# Altium integrated library Weidmueller_OMNIMATE_Power.IntLib: 508 symbols (part 4 of 9) (continued)
## 1140980000_Single (continued)
OMNIMATE Power - series BL/SL 7.62HP; PartNumber: 1140980000; Manufacturer: Weidmueller; Short_text_for_material: SL 7.62HP/02/180F 3.2 SN OR BX; Side_termination_characteristic: Flange; Mounting_onto_the_PCB: Solder connection; Pitch_mm: 7.62 mm; Pitch_inch: 0.3 inch; No_of_poles: 2; Outgoing_elbow: 180°; Solder_pin_length_mm: 3.2 mm; Contact_surface: tinned; Insulating_material: PBT; UL_94_flammability_rating: V-0; Rated_voltage_for_surge_voltage_class_pollution_degree_II_2: 630 V; Rated_current_min_no_of_poles_TU_20_deg_C: 29 A; Rated_voltage_use_group_B_UL_1059: 300 V; Rated_current_use_group_B_UL_1059: 20 A; PackageReference: SL_7_62HP_180F_02; Colour: Orange; Packaging: Box; Qty: 100 PCS; Revision: V1; ComponentLink1Description: Manufacturer URL; ComponentLink1URL: http://www.weidmueller.com/; ComponentLink2Description: URL Link1; ComponentLink2URL: http://catalog.weidmueller.com/catalog/Start.do?localeId=en&ObjectID=1140980000
footprint SL_7_62HP_180F_02 (OMNIMATE Power - Serie BL/SL 7.62HP  SL 7.62HP/02/180F 3.2)
part A pins: A1
part B pins: A2

## 1140990000
designator J?
OMNIMATE Power - series BL/SL 7.62HP; PartNumber: 1140990000; Manufacturer: Weidmueller; Short_text_for_material: SL 7.62HP/03/180F 3.2 SN OR BX; Side_termination_characteristic: Flange; Mounting_onto_the_PCB: Solder connection; Pitch_mm: 7.62 mm; Pitch_inch: 0.3 inch; No_of_poles: 3; Outgoing_elbow: 180°; Solder_pin_length_mm: 3.2 mm; Contact_surface: tinned; Insulating_material: PBT; UL_94_flammability_rating: V-0; Rated_voltage_for_surge_voltage_class_pollution_degree_II_2: 630 V; Rated_current_min_no_of_poles_TU_20_deg_C: 29 A; Rated_voltage_use_group_B_UL_1059: 300 V; Rated_current_use_group_B_UL_1059: 20 A; PackageReference: SL_7_62HP_180F_03; Colour: Orange; Packaging: Box; Qty: 100 PCS; Revision: V1; ComponentLink1Description: Manufacturer URL; ComponentLink1URL: http://www.weidmueller.com/; ComponentLink2Description: URL Link1; ComponentLink2URL: http://catalog.weidmueller.com/catalog/Start.do?localeId=en&ObjectID=1140990000
footprint SL_7_62HP_180F_03 (OMNIMATE Power - Serie BL/SL 7.62HP  SL 7.62HP/03/180F 3.2)
pins: A1, A2, A3

## 1140990000_Single
designator J?
OMNIMATE Power - series BL/SL 7.62HP; PartNumber: 1140990000; Manufacturer: Weidmueller; Short_text_for_material: SL 7.62HP/03/180F 3.2 SN OR BX; Side_termination_characteristic: Flange; Mounting_onto_the_PCB: Solder connection; Pitch_mm: 7.62 mm; Pitch_inch: 0.3 inch; No_of_poles: 3; Outgoing_elbow: 180°; Solder_pin_length_mm: 3.2 mm; Contact_surface: tinned; Insulating_material: PBT; UL_94_flammability_rating: V-0; Rated_voltage_for_surge_voltage_class_pollution_degree_II_2: 630 V; Rated_current_min_no_of_poles_TU_20_deg_C: 29 A; Rated_voltage_use_group_B_UL_1059: 300 V; Rated_current_use_group_B_UL_1059: 20 A; PackageReference: SL_7_62HP_180F_03; Colour: Orange; Packaging: Box; Qty: 100 PCS; Revision: V1; ComponentLink1Description: Manufacturer URL; ComponentLink1URL: http://www.weidmueller.com/; ComponentLink2Description: URL Link1; ComponentLink2URL: http://catalog.weidmueller.com/catalog/Start.do?localeId=en&ObjectID=1140990000
footprint SL_7_62HP_180F_03 (OMNIMATE Power - Serie BL/SL 7.62HP  SL 7.62HP/03/180F 3.2)
part A pins: A1
part B pins: A2
part C pins: A3

## 1141000000
designator J?
OMNIMATE Power - series BL/SL 7.62HP; PartNumber: 1141000000; Manufacturer: Weidmueller; Short_text_for_material: SL 7.62HP/04/180F 3.2 SN OR BX; Side_termination_characteristic: Flange; Mounting_onto_the_PCB: Solder connection; Pitch_mm: 7.62 mm; Pitch_inch: 0.3 inch; No_of_poles: 4; Outgoing_elbow: 180°; Solder_pin_length_mm: 3.2 mm; Contact_surface: tinned; Insulating_material: PBT; UL_94_flammability_rating: V-0; Rated_voltage_for_surge_voltage_class_pollution_degree_II_2: 630 V; Rated_current_min_no_of_poles_TU_20_deg_C: 29 A; Rated_voltage_use_group_B_UL_1059: 300 V; Rated_current_use_group_B_UL_1059: 20 A; PackageReference: SL_7_62HP_180F_04; Colour: Orange; Packaging: Box; Qty: 100 PCS; Revision: V1; ComponentLink1Description: Manufacturer URL; ComponentLink1URL: http://www.weidmueller.com/; ComponentLink2Description: URL Link1; ComponentLink2URL: http://catalog.weidmueller.com/catalog/Start.do?localeId=en&ObjectID=1141000000
footprint SL_7_62HP_180F_04 (OMNIMATE Power - Serie BL/SL 7.62HP  SL 7.62HP/04/180F 3.2)
pins: A1, A2, A3, A4

## 1141000000_Single
designator J?
OMNIMATE Power - series BL/SL 7.62HP; PartNumber: 1141000000; Manufacturer: Weidmueller; Short_text_for_material: SL 7.62HP/04/180F 3.2 SN OR BX; Side_termination_characteristic: Flange; Mounting_onto_the_PCB: Solder connection; Pitch_mm: 7.62 mm; Pitch_inch: 0.3 inch; No_of_poles: 4; Outgoing_elbow: 180°; Solder_pin_length_mm: 3.2 mm; Contact_surface: tinned; Insulating_material: PBT; UL_94_flammability_rating: V-0; Rated_voltage_for_surge_voltage_class_pollution_degree_II_2: 630 V; Rated_current_min_no_of_poles_TU_20_deg_C: 29 A; Rated_voltage_use_group_B_UL_1059: 300 V; Rated_current_use_group_B_UL_1059: 20 A; PackageReference: SL_7_62HP_180F_04; Colour: Orange; Packaging: Box; Qty: 100 PCS; Revision: V1; ComponentLink1Description: Manufacturer URL; ComponentLink1URL: http://www.weidmueller.com/; ComponentLink2Description: URL Link1; ComponentLink2URL: http://catalog.weidmueller.com/catalog/Start.do?localeId=en&ObjectID=1141000000
footprint SL_7_62HP_180F_04 (OMNIMATE Power - Serie BL/SL 7.62HP  SL 7.62HP/04/180F 3.2)
part A pins: A1
part B pins: A2
part C pins: A3
part D pins: A4

## 1141040000
designator J?
OMNIMATE Power - series BL/SL 7.62HP; PartNumber: 1141040000; Manufacturer: Weidmueller; Short_text_for_material: SL 7.62HP/08/180F 3.2 SN OR BX; Side_termination_characteristic: Flange; Mounting_onto_the_PCB: Solder connection; Pitch_mm: 7.62 mm; Pitch_inch: 0.3 inch; No_of_poles: 8; Outgoing_elbow: 180°; Solder_pin_length_mm: 3.2 mm; Contact_surface: tinned; Insulating_material: PBT; UL_94_flammability_rating: V-0; Rated_voltage_for_surge_voltage_class_pollution_degree_II_2: 630 V; Rated_current_min_no_of_poles_TU_20_deg_C: 29 A; Rated_voltage_use_group_B_UL_1059: 300 V; Rated_current_use_group_B_UL_1059: 20 A; PackageReference: SL_7_62HP_180F_08; Colour: Orange; Packaging: Box; Qty: 50 PCS; Revision: V1; ComponentLink1Description: Manufacturer URL; ComponentLink1URL: http://www.weidmueller.com/; ComponentLink2Description: URL Link1; ComponentLink2URL: http://catalog.weidmueller.com/catalog/Start.do?localeId=en&ObjectID=1141040000
footprint SL_7_62HP_180F_08 (OMNIMATE Power - Serie BL/SL 7.62HP  SL 7.62HP/08/180F 3.2)
pins: A1, A2, A3, A4, A5, A6, A7, A8

## 1141040000_Single
designator J?
OMNIMATE Power - series BL/SL 7.62HP; PartNumber: 1141040000; Manufacturer: Weidmueller; Short_text_for_material: SL 7.62HP/08/180F 3.2 SN OR BX; Side_termination_characteristic: Flange; Mounting_onto_the_PCB: Solder connection; Pitch_mm: 7.62 mm; Pitch_inch: 0.3 inch; No_of_poles: 8; Outgoing_elbow: 180°; Solder_pin_length_mm: 3.2 mm; Contact_surface: tinned; Insulating_material: PBT; UL_94_flammability_rating: V-0; Rated_voltage_for_surge_voltage_class_pollution_degree_II_2: 630 V; Rated_current_min_no_of_poles_TU_20_deg_C: 29 A; Rated_voltage_use_group_B_UL_1059: 300 V; Rated_current_use_group_B_UL_1059: 20 A; PackageReference: SL_7_62HP_180F_08; Colour: Orange; Packaging: Box; Qty: 50 PCS; Revision: V1; ComponentLink1Description: Manufacturer URL; ComponentLink1URL: http://www.weidmueller.com/; ComponentLink2Description: URL Link1; ComponentLink2URL: http://catalog.weidmueller.com/catalog/Start.do?localeId=en&ObjectID=1141040000
footprint SL_7_62HP_180F_08 (OMNIMATE Power - Serie BL/SL 7.62HP  SL 7.62HP/08/180F 3.2)
part A pins: A1
part B pins: A2
part C pins: A3
part D pins: A4
part E pins: A5
part F pins: A6
part G pins: A7
part H pins: A8

## 1156130000
designator J?
OMNIMATE Power - series BV/SV 7.62HP; PartNumber: 1156130000; Manufacturer: Weidmueller; Short_text_for_material: SV 7.62HP/02/270MSF2 SC/08R SN BK BX; Side_termination_characteristic: closed side; Note: Middle screw flange; Mounting_onto_the_PCB: Solder connection; Pitch_mm: 7.62 mm; Pitch_inch: 0.3 inch; No_of_poles: 2; Outgoing_elbow: 270°; Solder_pin_length_mm: 3.5 mm; Contact_material: Cu-Leg; Contact_surface: tinned; Insulating_material: PA GF; UL_94_flammability_rating: V-0; Rated_voltage_for_surge_voltage_class_pollution_degree_II_2: 1000 V; Rated_voltage_use_group_B_UL_1059: 300 V; Rated_current_use_group_B_UL_1059: 35 A; PackageReference: SV_7_62HP_02_SC_3_81_270MSF_08; Colour: Black; Packaging: Box; Qty: 48 PCS; Revision: V1; ComponentLink1Description: Manufacturer URL; ComponentLink1URL: http://www.weidmueller.com/; ComponentLink2Description: URL Link1; ComponentLink2URL: http://catalog.weidmueller.com/catalog/Start.do?localeId=en&ObjectID=1156130000
footprint SV_7_62HP_02_SC_3_81_270MSF_08 (OMNIMATE Power - Serie BV/SV 7.62HP  SV 7.62HP/02/270MSF2 SC/08R)
part A pins: P1, P2
part B pins: SA1, SA2, SA3, SA4
part C pins: SB1, SB2, SB3, SB4

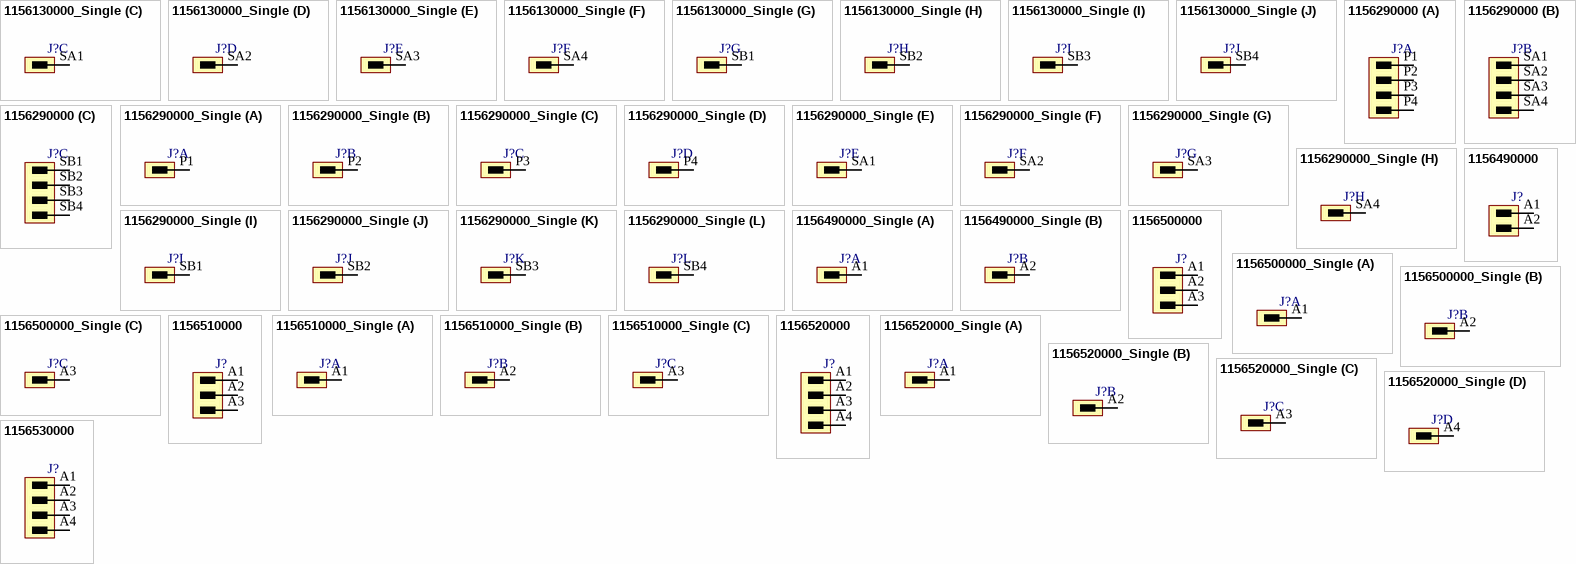
[diagram p13: symbols 1156130000_Single to 1156530000]

## 1156130000_Single
designator J?
OMNIMATE Power - series BV/SV 7.62HP; PartNumber: 1156130000; Manufacturer: Weidmueller; Short_text_for_material: SV 7.62HP/02/270MSF2 SC/08R SN BK BX; Side_termination_characteristic: closed side; Note: Middle screw flange; Mounting_onto_the_PCB: Solder connection; Pitch_mm: 7.62 mm; Pitch_inch: 0.3 inch; No_of_poles: 2; Outgoing_elbow: 270°; Solder_pin_length_mm: 3.5 mm; Contact_material: Cu-Leg; Contact_surface: tinned; Insulating_material: PA GF; UL_94_flammability_rating: V-0; Rated_voltage_for_surge_voltage_class_pollution_degree_II_2: 1000 V; Rated_voltage_use_group_B_UL_1059: 300 V; Rated_current_use_group_B_UL_1059: 35 A; PackageReference: SV_7_62HP_02_SC_3_81_270MSF_08; Colour: Black; Packaging: Box; Qty: 48 PCS; Revision: V1; ComponentLink1Description: Manufacturer URL; ComponentLink1URL: http://www.weidmueller.com/; ComponentLink2Description: URL Link1; ComponentLink2URL: http://catalog.weidmueller.com/catalog/Start.do?localeId=en&ObjectID=1156130000
footprint SV_7_62HP_02_SC_3_81_270MSF_08 (OMNIMATE Power - Serie BV/SV 7.62HP  SV 7.62HP/02/270MSF2 SC/08R)
part A pins: P1
part B pins: P2
part C pins: SA1
part D pins: SA2
part E pins: SA3
part F pins: SA4
part G pins: SB1
part H pins: SB2
part I pins: SB3
part J pins: SB4

## 1156290000
designator J?
OMNIMATE Power - series BV/SV 7.62HP; PartNumber: 1156290000; Manufacturer: Weidmueller; Short_text_for_material: SV 7.62HP/04/270MSF4 SC/08R SN BK BX; Side_termination_characteristic: closed side; Note: Middle screw flange; Mounting_onto_the_PCB: Solder connection; Pitch_mm: 7.62 mm; Pitch_inch: 0.3 inch; No_of_poles: 4; Outgoing_elbow: 270°; Solder_pin_length_mm: 3.5 mm; Contact_material: Cu-Leg; Contact_surface: tinned; Insulating_material: PA GF; UL_94_flammability_rating: V-0; Rated_voltage_for_surge_voltage_class_pollution_degree_II_2: 1000 V; Rated_voltage_use_group_B_UL_1059: 300 V; Rated_current_use_group_B_UL_1059: 35 A; PackageReference: SV_7_62HP_04_SC_3_81_270MSF_08; Colour: Black; Packaging: Box; Qty: 30 PCS; Revision: V1; ComponentLink1Description: Manufacturer URL; ComponentLink1URL: http://www.weidmueller.com/; ComponentLink2Description: URL Link1; ComponentLink2URL: http://catalog.weidmueller.com/catalog/Start.do?localeId=en&ObjectID=1156290000
footprint SV_7_62HP_04_SC_3_81_270MSF_08 (OMNIMATE Power - Serie BV/SV 7.62HP  SV 7.62HP/04/270MSF4 SC/08)
part A pins: P1, P2, P3, P4
part B pins: SA1, SA2, SA3, SA4
part C pins: SB1, SB2, SB3, SB4

## 1156290000_Single
designator J?
OMNIMATE Power - series BV/SV 7.62HP; PartNumber: 1156290000; Manufacturer: Weidmueller; Short_text_for_material: SV 7.62HP/04/270MSF4 SC/08R SN BK BX; Side_termination_characteristic: closed side; Note: Middle screw flange; Mounting_onto_the_PCB: Solder connection; Pitch_mm: 7.62 mm; Pitch_inch: 0.3 inch; No_of_poles: 4; Outgoing_elbow: 270°; Solder_pin_length_mm: 3.5 mm; Contact_material: Cu-Leg; Contact_surface: tinned; Insulating_material: PA GF; UL_94_flammability_rating: V-0; Rated_voltage_for_surge_voltage_class_pollution_degree_II_2: 1000 V; Rated_voltage_use_group_B_UL_1059: 300 V; Rated_current_use_group_B_UL_1059: 35 A; PackageReference: SV_7_62HP_04_SC_3_81_270MSF_08; Colour: Black; Packaging: Box; Qty: 30 PCS; Revision: V1; ComponentLink1Description: Manufacturer URL; ComponentLink1URL: http://www.weidmueller.com/; ComponentLink2Description: URL Link1; ComponentLink2URL: http://catalog.weidmueller.com/catalog/Start.do?localeId=en&ObjectID=1156290000
footprint SV_7_62HP_04_SC_3_81_270MSF_08 (OMNIMATE Power - Serie BV/SV 7.62HP  SV 7.62HP/04/270MSF4 SC/08)
part A pins: P1
part B pins: P2
part C pins: P3
part D pins: P4
part E pins: SA1
part F pins: SA2
part G pins: SA3
part H pins: SA4
part I pins: SB1
part J pins: SB2
part K pins: SB3
part L pins: SB4

## 1156490000
designator J?
OMNIMATE Power - series BV/SV 7.62IT; PartNumber: 1156490000; Manufacturer: Weidmueller; Short_text_for_material: SV 7.62IT/02/270MF2 3.5SN BK BX SO; Side_termination_characteristic: closed side; Note: Middle flange; Mounting_onto_the_PCB: Solder connection; Pitch_mm: 7.62 mm; Pitch_inch: 0.3 inch; No_of_poles: 2; Outgoing_elbow: 270°; Solder_pin_length_mm: 3.5 mm; Contact_material: Cu-Leg; Contact_surface: tinned; Insulating_material: PA GF; UL_94_flammability_rating: V-0; Rated_voltage_for_surge_voltage_class_pollution_degree_II_2: 1000 V; Rated_voltage_use_group_B_UL_1059: 300 V; Rated_current_use_group_B_UL_1059: 40.5 A; PackageReference: SV_7_62IT_270MF2_02; Colour: Black; Packaging: Box; Qty: 78 PCS; Revision: V1; ComponentLink1Description: Manufacturer URL; ComponentLink1URL: http://www.weidmueller.com/; ComponentLink2Description: URL Link1; ComponentLink2URL: http://catalog.weidmueller.com/catalog/Start.do?localeId=en&ObjectID=1156490000
footprint SV_7_62IT_270MF2_02 (OMNIMATE Power - Serie BV/SV 7.62IT  SV 7.62IT/02/270MF2 3.5)
pins: A1, A2

## 1156490000_Single
designator J?
OMNIMATE Power - series BV/SV 7.62IT; PartNumber: 1156490000; Manufacturer: Weidmueller; Short_text_for_material: SV 7.62IT/02/270MF2 3.5SN BK BX SO; Side_termination_characteristic: closed side; Note: Middle flange; Mounting_onto_the_PCB: Solder connection; Pitch_mm: 7.62 mm; Pitch_inch: 0.3 inch; No_of_poles: 2; Outgoing_elbow: 270°; Solder_pin_length_mm: 3.5 mm; Contact_material: Cu-Leg; Contact_surface: tinned; Insulating_material: PA GF; UL_94_flammability_rating: V-0; Rated_voltage_for_surge_voltage_class_pollution_degree_II_2: 1000 V; Rated_voltage_use_group_B_UL_1059: 300 V; Rated_current_use_group_B_UL_1059: 40.5 A; PackageReference: SV_7_62IT_270MF2_02; Colour: Black; Packaging: Box; Qty: 78 PCS; Revision: V1; ComponentLink1Description: Manufacturer URL; ComponentLink1URL: http://www.weidmueller.com/; ComponentLink2Description: URL Link1; ComponentLink2URL: http://catalog.weidmueller.com/catalog/Start.do?localeId=en&ObjectID=1156490000
footprint SV_7_62IT_270MF2_02 (OMNIMATE Power - Serie BV/SV 7.62IT  SV 7.62IT/02/270MF2 3.5)
part A pins: A1
part B pins: A2

## 1156500000
designator J?
OMNIMATE Power - series BV/SV 7.62IT; PartNumber: 1156500000; Manufacturer: Weidmueller; Short_text_for_material: SV 7.62IT/03/270MF2 3.5SN BK BX; Side_termination_characteristic: closed side; Note: Middle flange; Mounting_onto_the_PCB: Solder connection; Pitch_mm: 7.62 mm; Pitch_inch: 0.3 inch; No_of_poles: 3; Outgoing_elbow: 270°; Solder_pin_length_mm: 3.5 mm; Contact_material: Cu-Leg; Contact_surface: tinned; Insulating_material: PA GF; UL_94_flammability_rating: V-0; Rated_voltage_for_surge_voltage_class_pollution_degree_II_2: 1000 V; Rated_voltage_use_group_B_UL_1059: 300 V; Rated_current_use_group_B_UL_1059: 40.5 A; PackageReference: SV_7_62IT_270MF2_03; Colour: Black; Packaging: Box; Qty: 60 PCS; Revision: V1; ComponentLink1Description: Manufacturer URL; ComponentLink1URL: http://www.weidmueller.com/; ComponentLink2Description: URL Link1; ComponentLink2URL: http://catalog.weidmueller.com/catalog/Start.do?localeId=en&ObjectID=1156500000
footprint SV_7_62IT_270MF2_03 (OMNIMATE Power - Serie BV/SV 7.62IT  SV 7.62IT/02/270MF3 3.5)
pins: A1, A2, A3

## 1156500000_Single
designator J?
OMNIMATE Power - series BV/SV 7.62IT; PartNumber: 1156500000; Manufacturer: Weidmueller; Short_text_for_material: SV 7.62IT/03/270MF2 3.5SN BK BX; Side_termination_characteristic: closed side; Note: Middle flange; Mounting_onto_the_PCB: Solder connection; Pitch_mm: 7.62 mm; Pitch_inch: 0.3 inch; No_of_poles: 3; Outgoing_elbow: 270°; Solder_pin_length_mm: 3.5 mm; Contact_material: Cu-Leg; Contact_surface: tinned; Insulating_material: PA GF; UL_94_flammability_rating: V-0; Rated_voltage_for_surge_voltage_class_pollution_degree_II_2: 1000 V; Rated_voltage_use_group_B_UL_1059: 300 V; Rated_current_use_group_B_UL_1059: 40.5 A; PackageReference: SV_7_62IT_270MF2_03; Colour: Black; Packaging: Box; Qty: 60 PCS; Revision: V1; ComponentLink1Description: Manufacturer URL; ComponentLink1URL: http://www.weidmueller.com/; ComponentLink2Description: URL Link1; ComponentLink2URL: http://catalog.weidmueller.com/catalog/Start.do?localeId=en&ObjectID=1156500000
footprint SV_7_62IT_270MF2_03 (OMNIMATE Power - Serie BV/SV 7.62IT  SV 7.62IT/02/270MF3 3.5)
part A pins: A1
part B pins: A2
part C pins: A3

## 1156510000
designator J?
OMNIMATE Power - series BV/SV 7.62IT; PartNumber: 1156510000; Manufacturer: Weidmueller; Short_text_for_material: SV 7.62IT/03/270MF3 3.5SN BK BX; Side_termination_characteristic: closed side; Note: Middle flange; Mounting_onto_the_PCB: Solder connection; Pitch_mm: 7.62 mm; Pitch_inch: 0.3 inch; No_of_poles: 3; Outgoing_elbow: 270°; Solder_pin_length_mm: 3.5 mm; Contact_material: Cu-Leg; Contact_surface: tinned; Insulating_material: PA GF; UL_94_flammability_rating: V-0; Rated_voltage_for_surge_voltage_class_pollution_degree_II_2: 1000 V; Rated_voltage_use_group_B_UL_1059: 300 V; Rated_current_use_group_B_UL_1059: 40.5 A; PackageReference: SV_7_62IT_270MF3_03; Colour: Black; Packaging: Box; Qty: 60 PCS; Revision: V1; ComponentLink1Description: Manufacturer URL; ComponentLink1URL: http://www.weidmueller.com/; ComponentLink2Description: URL Link1; ComponentLink2URL: http://catalog.weidmueller.com/catalog/Start.do?localeId=en&ObjectID=1156510000
footprint SV_7_62IT_270MF3_03 (OMNIMATE Power - Serie BV/SV 7.62IT  SV 7.62IT/03/270MF3 3.5)
pins: A1, A2, A3

## 1156510000_Single
designator J?
OMNIMATE Power - series BV/SV 7.62IT; PartNumber: 1156510000; Manufacturer: Weidmueller; Short_text_for_material: SV 7.62IT/03/270MF3 3.5SN BK BX; Side_termination_characteristic: closed side; Note: Middle flange; Mounting_onto_the_PCB: Solder connection; Pitch_mm: 7.62 mm; Pitch_inch: 0.3 inch; No_of_poles: 3; Outgoing_elbow: 270°; Solder_pin_length_mm: 3.5 mm; Contact_material: Cu-Leg; Contact_surface: tinned; Insulating_material: PA GF; UL_94_flammability_rating: V-0; Rated_voltage_for_surge_voltage_class_pollution_degree_II_2: 1000 V; Rated_voltage_use_group_B_UL_1059: 300 V; Rated_current_use_group_B_UL_1059: 40.5 A; PackageReference: SV_7_62IT_270MF3_03; Colour: Black; Packaging: Box; Qty: 60 PCS; Revision: V1; ComponentLink1Description: Manufacturer URL; ComponentLink1URL: http://www.weidmueller.com/; ComponentLink2Description: URL Link1; ComponentLink2URL: http://catalog.weidmueller.com/catalog/Start.do?localeId=en&ObjectID=1156510000
footprint SV_7_62IT_270MF3_03 (OMNIMATE Power - Serie BV/SV 7.62IT  SV 7.62IT/03/270MF3 3.5)
part A pins: A1
part B pins: A2
part C pins: A3

## 1156520000
designator J?
OMNIMATE Power - series BV/SV 7.62IT; PartNumber: 1156520000; Manufacturer: Weidmueller; Short_text_for_material: SV 7.62IT/04/270MF2 3.5SN BK BX; Side_termination_characteristic: closed side; Note: Middle flange; Mounting_onto_the_PCB: Solder connection; Pitch_mm: 7.62 mm; Pitch_inch: 0.3 inch; No_of_poles: 4; Outgoing_elbow: 270°; Solder_pin_length_mm: 3.5 mm; Contact_material: Cu-Leg; Contact_surface: tinned; Insulating_material: PA GF; UL_94_flammability_rating: V-0; Rated_voltage_for_surge_voltage_class_pollution_degree_II_2: 1000 V; Rated_voltage_use_group_B_UL_1059: 300 V; Rated_current_use_group_B_UL_1059: 40.5 A; PackageReference: SV_7_62IT_270MF2_04; Colour: Black; Packaging: Box; Qty: 48 PCS; Revision: V1; ComponentLink1Description: Manufacturer URL; ComponentLink1URL: http://www.weidmueller.com/; ComponentLink2Description: URL Link1; ComponentLink2URL: http://catalog.weidmueller.com/catalog/Start.do?localeId=en&ObjectID=1156520000
footprint SV_7_62IT_270MF2_04 (OMNIMATE Power - Serie BV/SV 7.62IT  SV 7.62IT/02/270MF4 3.5)
pins: A1, A2, A3, A4

## 1156520000_Single
designator J?
OMNIMATE Power - series BV/SV 7.62IT; PartNumber: 1156520000; Manufacturer: Weidmueller; Short_text_for_material: SV 7.62IT/04/270MF2 3.5SN BK BX; Side_termination_characteristic: closed side; Note: Middle flange; Mounting_onto_the_PCB: Solder connection; Pitch_mm: 7.62 mm; Pitch_inch: 0.3 inch; No_of_poles: 4; Outgoing_elbow: 270°; Solder_pin_length_mm: 3.5 mm; Contact_material: Cu-Leg; Contact_surface: tinned; Insulating_material: PA GF; UL_94_flammability_rating: V-0; Rated_voltage_for_surge_voltage_class_pollution_degree_II_2: 1000 V; Rated_voltage_use_group_B_UL_1059: 300 V; Rated_current_use_group_B_UL_1059: 40.5 A; PackageReference: SV_7_62IT_270MF2_04; Colour: Black; Packaging: Box; Qty: 48 PCS; Revision: V1; ComponentLink1Description: Manufacturer URL; ComponentLink1URL: http://www.weidmueller.com/; ComponentLink2Description: URL Link1; ComponentLink2URL: http://catalog.weidmueller.com/catalog/Start.do?localeId=en&ObjectID=1156520000
footprint SV_7_62IT_270MF2_04 (OMNIMATE Power - Serie BV/SV 7.62IT  SV 7.62IT/02/270MF4 3.5)
part A pins: A1
part B pins: A2
part C pins: A3
part D pins: A4

## 1156530000
designator J?
OMNIMATE Power - series BV/SV 7.62IT; PartNumber: 1156530000; Manufacturer: Weidmueller; Short_text_for_material: SV 7.62IT/04/270MF4 3.5SN BK BX; Side_termination_characteristic: closed side; Note: Middle flange; Mounting_onto_the_PCB: Solder connection; Pitch_mm: 7.62 mm; Pitch_inch: 0.3 inch; No_of_poles: 4; Outgoing_elbow: 270°; Solder_pin_length_mm: 3.5 mm; Contact_material: Cu-Leg; Contact_surface: tinned; Insulating_material: PA GF; UL_94_flammability_rating: V-0; Rated_voltage_for_surge_voltage_class_pollution_degree_II_2: 1000 V; Rated_voltage_use_group_B_UL_1059: 300 V; Rated_current_use_group_B_UL_1059: 40.5 A; PackageReference: SV_7_62IT_270MF4_04; Colour: Black; Packaging: Box; Qty: 48 PCS; Revision: V1; ComponentLink1Description: Manufacturer URL; ComponentLink1URL: http://www.weidmueller.com/; ComponentLink2Description: URL Link1; ComponentLink2URL: http://catalog.weidmueller.com/catalog/Start.do?localeId=en&ObjectID=1156530000
footprint SV_7_62IT_270MF4_04 (OMNIMATE Power - Serie BV/SV 7.62IT  SV 7.62IT/04/270MF4 3.5)
pins: A1, A2, A3, A4

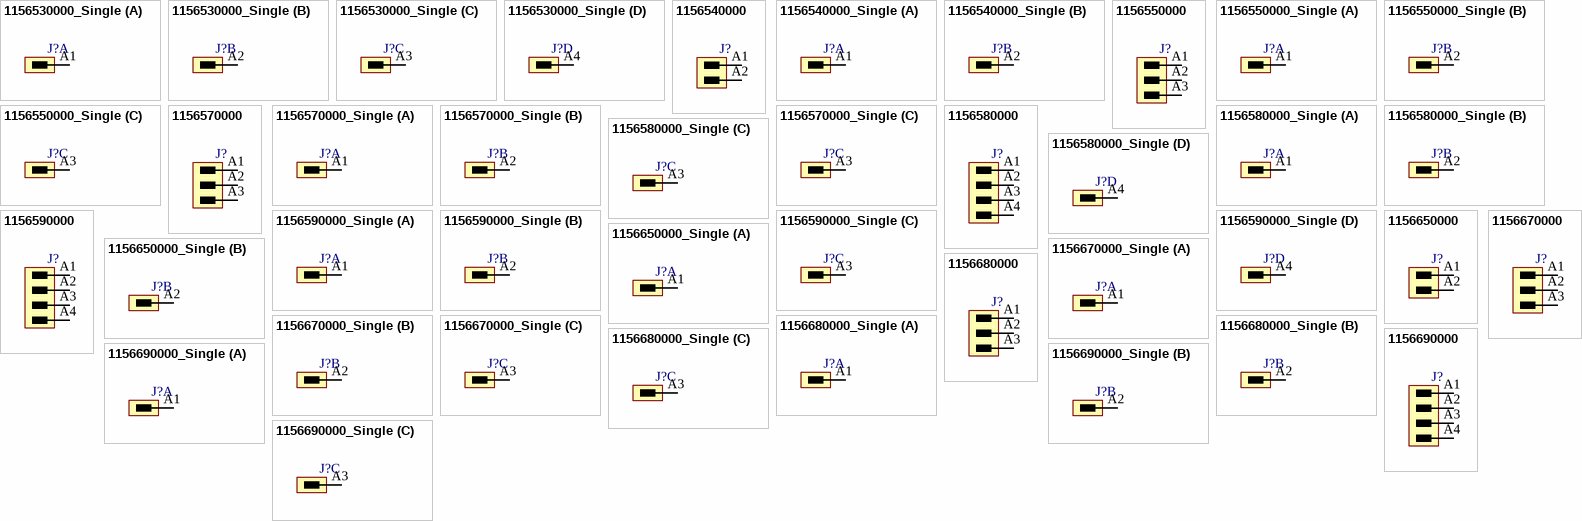
[diagram p14: symbols 1156530000_Single to 1156690000_Single]

## 1156530000_Single
designator J?
OMNIMATE Power - series BV/SV 7.62IT; PartNumber: 1156530000; Manufacturer: Weidmueller; Short_text_for_material: SV 7.62IT/04/270MF4 3.5SN BK BX; Side_termination_characteristic: closed side; Note: Middle flange; Mounting_onto_the_PCB: Solder connection; Pitch_mm: 7.62 mm; Pitch_inch: 0.3 inch; No_of_poles: 4; Outgoing_elbow: 270°; Solder_pin_length_mm: 3.5 mm; Contact_material: Cu-Leg; Contact_surface: tinned; Insulating_material: PA GF; UL_94_flammability_rating: V-0; Rated_voltage_for_surge_voltage_class_pollution_degree_II_2: 1000 V; Rated_voltage_use_group_B_UL_1059: 300 V; Rated_current_use_group_B_UL_1059: 40.5 A; PackageReference: SV_7_62IT_270MF4_04; Colour: Black; Packaging: Box; Qty: 48 PCS; Revision: V1; ComponentLink1Description: Manufacturer URL; ComponentLink1URL: http://www.weidmueller.com/; ComponentLink2Description: URL Link1; ComponentLink2URL: http://catalog.weidmueller.com/catalog/Start.do?localeId=en&ObjectID=1156530000
footprint SV_7_62IT_270MF4_04 (OMNIMATE Power - Serie BV/SV 7.62IT  SV 7.62IT/04/270MF4 3.5)
part A pins: A1
part B pins: A2
part C pins: A3
part D pins: A4

## 1156540000
designator J?
OMNIMATE Power - series BV/SV 7.62IT; PartNumber: 1156540000; Manufacturer: Weidmueller; Short_text_for_material: SV 7.62IT/02/90MF2 3.5SN BK BX SO; Side_termination_characteristic: closed side; Note: Middle flange; Mounting_onto_the_PCB: Solder connection; Pitch_mm: 7.62 mm; Pitch_inch: 0.3 inch; No_of_poles: 2; Outgoing_elbow: 270°; Solder_pin_length_mm: 3.5 mm; Contact_material: Cu-Leg; Contact_surface: tinned; Insulating_material: PA GF; UL_94_flammability_rating: V-0; Rated_voltage_for_surge_voltage_class_pollution_degree_II_2: 1000 V; Rated_voltage_use_group_B_UL_1059: 300 V; Rated_current_use_group_B_UL_1059: 40.5 A; PackageReference: SV_7_62IT_90MF2_02; Colour: Black; Packaging: Box; Qty: 78 PCS; Revision: V1; ComponentLink1Description: Manufacturer URL; ComponentLink1URL: http://www.weidmueller.com/; ComponentLink2Description: URL Link1; ComponentLink2URL: http://catalog.weidmueller.com/catalog/Start.do?localeId=en&ObjectID=1156540000
footprint SV_7_62IT_90MF2_02 (OMNIMATE Power - Serie BV/SV 7.62IT  SV 7.62IT/02/90MF2 3.5)
pins: A1, A2

## 1156540000_Single
designator J?
OMNIMATE Power - series BV/SV 7.62IT; PartNumber: 1156540000; Manufacturer: Weidmueller; Short_text_for_material: SV 7.62IT/02/90MF2 3.5SN BK BX SO; Side_termination_characteristic: closed side; Note: Middle flange; Mounting_onto_the_PCB: Solder connection; Pitch_mm: 7.62 mm; Pitch_inch: 0.3 inch; No_of_poles: 2; Outgoing_elbow: 270°; Solder_pin_length_mm: 3.5 mm; Contact_material: Cu-Leg; Contact_surface: tinned; Insulating_material: PA GF; UL_94_flammability_rating: V-0; Rated_voltage_for_surge_voltage_class_pollution_degree_II_2: 1000 V; Rated_voltage_use_group_B_UL_1059: 300 V; Rated_current_use_group_B_UL_1059: 40.5 A; PackageReference: SV_7_62IT_90MF2_02; Colour: Black; Packaging: Box; Qty: 78 PCS; Revision: V1; ComponentLink1Description: Manufacturer URL; ComponentLink1URL: http://www.weidmueller.com/; ComponentLink2Description: URL Link1; ComponentLink2URL: http://catalog.weidmueller.com/catalog/Start.do?localeId=en&ObjectID=1156540000
footprint SV_7_62IT_90MF2_02 (OMNIMATE Power - Serie BV/SV 7.62IT  SV 7.62IT/02/90MF2 3.5)
part A pins: A1
part B pins: A2

## 1156550000
designator J?
OMNIMATE Power - series BV/SV 7.62IT; PartNumber: 1156550000; Manufacturer: Weidmueller; Short_text_for_material: SV 7.62IT/03/90MF2 3.5SN BK BX; Side_termination_characteristic: closed side; Note: Middle flange; Mounting_onto_the_PCB: Solder connection; Pitch_mm: 7.62 mm; Pitch_inch: 0.3 inch; No_of_poles: 3; Outgoing_elbow: 270°; Solder_pin_length_mm: 3.5 mm; Contact_material: Cu-Leg; Contact_surface: tinned; Insulating_material: PA GF; UL_94_flammability_rating: V-0; Rated_voltage_for_surge_voltage_class_pollution_degree_II_2: 1000 V; Rated_voltage_use_group_B_UL_1059: 300 V; Rated_current_use_group_B_UL_1059: 40.5 A; PackageReference: SV_7_62IT_90MF2_03; Colour: Black; Packaging: Box; Qty: 60 PCS; Revision: V1; ComponentLink1Description: Manufacturer URL; ComponentLink1URL: http://www.weidmueller.com/; ComponentLink2Description: URL Link1; ComponentLink2URL: http://catalog.weidmueller.com/catalog/Start.do?localeId=en&ObjectID=1156550000
footprint SV_7_62IT_90MF2_03 (OMNIMATE Power - Serie BV/SV 7.62IT  SV 7.62IT/02/90MF3 3.5)
pins: A1, A2, A3

## 1156550000_Single
designator J?
OMNIMATE Power - series BV/SV 7.62IT; PartNumber: 1156550000; Manufacturer: Weidmueller; Short_text_for_material: SV 7.62IT/03/90MF2 3.5SN BK BX; Side_termination_characteristic: closed side; Note: Middle flange; Mounting_onto_the_PCB: Solder connection; Pitch_mm: 7.62 mm; Pitch_inch: 0.3 inch; No_of_poles: 3; Outgoing_elbow: 270°; Solder_pin_length_mm: 3.5 mm; Contact_material: Cu-Leg; Contact_surface: tinned; Insulating_material: PA GF; UL_94_flammability_rating: V-0; Rated_voltage_for_surge_voltage_class_pollution_degree_II_2: 1000 V; Rated_voltage_use_group_B_UL_1059: 300 V; Rated_current_use_group_B_UL_1059: 40.5 A; PackageReference: SV_7_62IT_90MF2_03; Colour: Black; Packaging: Box; Qty: 60 PCS; Revision: V1; ComponentLink1Description: Manufacturer URL; ComponentLink1URL: http://www.weidmueller.com/; ComponentLink2Description: URL Link1; ComponentLink2URL: http://catalog.weidmueller.com/catalog/Start.do?localeId=en&ObjectID=1156550000
footprint SV_7_62IT_90MF2_03 (OMNIMATE Power - Serie BV/SV 7.62IT  SV 7.62IT/02/90MF3 3.5)
part A pins: A1
part B pins: A2
part C pins: A3

## 1156570000
designator J?
OMNIMATE Power - series BV/SV 7.62IT; PartNumber: 1156570000; Manufacturer: Weidmueller; Short_text_for_material: SV 7.62IT/03/90MF3 3.5SN BK BX; Side_termination_characteristic: closed side; Note: Middle flange; Mounting_onto_the_PCB: Solder connection; Pitch_mm: 7.62 mm; Pitch_inch: 0.3 inch; No_of_poles: 3; Outgoing_elbow: 270°; Solder_pin_length_mm: 3.5 mm; Contact_material: Cu-Leg; Contact_surface: tinned; Insulating_material: PA GF; UL_94_flammability_rating: V-0; Rated_voltage_for_surge_voltage_class_pollution_degree_II_2: 1000 V; Rated_voltage_use_group_B_UL_1059: 300 V; Rated_current_use_group_B_UL_1059: 40.5 A; PackageReference: SV_7_62IT_90MF3_03; Colour: Black; Packaging: Box; Qty: 60 PCS; Revision: V1; ComponentLink1Description: Manufacturer URL; ComponentLink1URL: http://www.weidmueller.com/; ComponentLink2Description: URL Link1; ComponentLink2URL: http://catalog.weidmueller.com/catalog/Start.do?localeId=en&ObjectID=1156570000
footprint SV_7_62IT_90MF3_03 (OMNIMATE Power - Serie BV/SV 7.62IT  SV 7.62IT/03/90MF3 3.5)
pins: A1, A2, A3

## 1156570000_Single
designator J?
OMNIMATE Power - series BV/SV 7.62IT; PartNumber: 1156570000; Manufacturer: Weidmueller; Short_text_for_material: SV 7.62IT/03/90MF3 3.5SN BK BX; Side_termination_characteristic: closed side; Note: Middle flange; Mounting_onto_the_PCB: Solder connection; Pitch_mm: 7.62 mm; Pitch_inch: 0.3 inch; No_of_poles: 3; Outgoing_elbow: 270°; Solder_pin_length_mm: 3.5 mm; Contact_material: Cu-Leg; Contact_surface: tinned; Insulating_material: PA GF; UL_94_flammability_rating: V-0; Rated_voltage_for_surge_voltage_class_pollution_degree_II_2: 1000 V; Rated_voltage_use_group_B_UL_1059: 300 V; Rated_current_use_group_B_UL_1059: 40.5 A; PackageReference: SV_7_62IT_90MF3_03; Colour: Black; Packaging: Box; Qty: 60 PCS; Revision: V1; ComponentLink1Description: Manufacturer URL; ComponentLink1URL: http://www.weidmueller.com/; ComponentLink2Description: URL Link1; ComponentLink2URL: http://catalog.weidmueller.com/catalog/Start.do?localeId=en&ObjectID=1156570000
footprint SV_7_62IT_90MF3_03 (OMNIMATE Power - Serie BV/SV 7.62IT  SV 7.62IT/03/90MF3 3.5)
part A pins: A1
part B pins: A2
part C pins: A3

## 1156580000
designator J?
OMNIMATE Power - series BV/SV 7.62IT; PartNumber: 1156580000; Manufacturer: Weidmueller; Short_text_for_material: SV 7.62IT/04/90MF2 3.5SN BK BX; Side_termination_characteristic: closed side; Note: Middle flange; Mounting_onto_the_PCB: Solder connection; Pitch_mm: 7.62 mm; Pitch_inch: 0.3 inch; No_of_poles: 4; Outgoing_elbow: 270°; Solder_pin_length_mm: 3.5 mm; Contact_material: Cu-Leg; Contact_surface: tinned; Insulating_material: PA GF; UL_94_flammability_rating: V-0; Rated_voltage_for_surge_voltage_class_pollution_degree_II_2: 1000 V; Rated_voltage_use_group_B_UL_1059: 300 V; Rated_current_use_group_B_UL_1059: 40.5 A; PackageReference: SV_7_62IT_90MF3_04; Colour: Black; Packaging: Box; Qty: 48 PCS; Revision: V1; ComponentLink1Description: Manufacturer URL; ComponentLink1URL: http://www.weidmueller.com/; ComponentLink2Description: URL Link1; ComponentLink2URL: http://catalog.weidmueller.com/catalog/Start.do?localeId=en&ObjectID=1156580000
footprint SV_7_62IT_90MF3_04 (OMNIMATE Power - Serie BV/SV 7.62IT  SV 7.62IT/03/90MF4 3.5)
pins: A1, A2, A3, A4

## 1156580000_Single
designator J?
OMNIMATE Power - series BV/SV 7.62IT; PartNumber: 1156580000; Manufacturer: Weidmueller; Short_text_for_material: SV 7.62IT/04/90MF2 3.5SN BK BX; Side_termination_characteristic: closed side; Note: Middle flange; Mounting_onto_the_PCB: Solder connection; Pitch_mm: 7.62 mm; Pitch_inch: 0.3 inch; No_of_poles: 4; Outgoing_elbow: 270°; Solder_pin_length_mm: 3.5 mm; Contact_material: Cu-Leg; Contact_surface: tinned; Insulating_material: PA GF; UL_94_flammability_rating: V-0; Rated_voltage_for_surge_voltage_class_pollution_degree_II_2: 1000 V; Rated_voltage_use_group_B_UL_1059: 300 V; Rated_current_use_group_B_UL_1059: 40.5 A; PackageReference: SV_7_62IT_90MF3_04; Colour: Black; Packaging: Box; Qty: 48 PCS; Revision: V1; ComponentLink1Description: Manufacturer URL; ComponentLink1URL: http://www.weidmueller.com/; ComponentLink2Description: URL Link1; ComponentLink2URL: http://catalog.weidmueller.com/catalog/Start.do?localeId=en&ObjectID=1156580000
footprint SV_7_62IT_90MF3_04 (OMNIMATE Power - Serie BV/SV 7.62IT  SV 7.62IT/03/90MF4 3.5)
part A pins: A1
part B pins: A2
part C pins: A3
part D pins: A4

## 1156590000
designator J?
OMNIMATE Power - series BV/SV 7.62IT; PartNumber: 1156590000; Manufacturer: Weidmueller; Short_text_for_material: SV 7.62IT/04/90MF4 3.5SN BK BX; Side_termination_characteristic: closed side; Note: Middle flange; Mounting_onto_the_PCB: Solder connection; Pitch_mm: 7.62 mm; Pitch_inch: 0.3 inch; No_of_poles: 4; Outgoing_elbow: 270°; Solder_pin_length_mm: 3.5 mm; Contact_material: Cu-Leg; Contact_surface: tinned; Insulating_material: PA GF; UL_94_flammability_rating: V-0; Rated_voltage_for_surge_voltage_class_pollution_degree_II_2: 1000 V; Rated_voltage_use_group_B_UL_1059: 300 V; Rated_current_use_group_B_UL_1059: 40.5 A; PackageReference: SV_7_62IT_90MF4_04; Colour: Black; Packaging: Box; Qty: 48 PCS; Revision: V1; ComponentLink1Description: Manufacturer URL; ComponentLink1URL: http://www.weidmueller.com/; ComponentLink2Description: URL Link1; ComponentLink2URL: http://catalog.weidmueller.com/catalog/Start.do?localeId=en&ObjectID=1156590000
footprint SV_7_62IT_90MF4_04 (OMNIMATE Power - Serie BV/SV 7.62IT  SV 7.62IT/04/90MF4 3.5)
pins: A1, A2, A3, A4

## 1156590000_Single
designator J?
OMNIMATE Power - series BV/SV 7.62IT; PartNumber: 1156590000; Manufacturer: Weidmueller; Short_text_for_material: SV 7.62IT/04/90MF4 3.5SN BK BX; Side_termination_characteristic: closed side; Note: Middle flange; Mounting_onto_the_PCB: Solder connection; Pitch_mm: 7.62 mm; Pitch_inch: 0.3 inch; No_of_poles: 4; Outgoing_elbow: 270°; Solder_pin_length_mm: 3.5 mm; Contact_material: Cu-Leg; Contact_surface: tinned; Insulating_material: PA GF; UL_94_flammability_rating: V-0; Rated_voltage_for_surge_voltage_class_pollution_degree_II_2: 1000 V; Rated_voltage_use_group_B_UL_1059: 300 V; Rated_current_use_group_B_UL_1059: 40.5 A; PackageReference: SV_7_62IT_90MF4_04; Colour: Black; Packaging: Box; Qty: 48 PCS; Revision: V1; ComponentLink1Description: Manufacturer URL; ComponentLink1URL: http://www.weidmueller.com/; ComponentLink2Description: URL Link1; ComponentLink2URL: http://catalog.weidmueller.com/catalog/Start.do?localeId=en&ObjectID=1156590000
footprint SV_7_62IT_90MF4_04 (OMNIMATE Power - Serie BV/SV 7.62IT  SV 7.62IT/04/90MF4 3.5)
part A pins: A1
part B pins: A2
part C pins: A3
part D pins: A4

## 1156650000
designator J?
OMNIMATE Power - series BU/SU 10.16IT; PartNumber: 1156650000; Manufacturer: Weidmueller; Short_text_for_material: SU 10.16IT/02/90MF2 3.5AG BK BX SO; Side_termination_characteristic: closed side; Note: Middle flange; Mounting_onto_the_PCB: Solder connection; Pitch_mm: 10.16 mm; Pitch_inch: 0.4 inch; No_of_poles: 2; Outgoing_elbow: 90°; Solder_pin_length_mm: 3.5 mm; Contact_material: Cu-Leg; Contact_surface: silver-plated; Insulating_material: PA GF; UL_94_flammability_rating: V-0; Rated_voltage_for_surge_voltage_class_pollution_degree_II_2: 1000 V; Rated_voltage_use_group_B_UL_1059: 300 V; Rated_current_use_group_B_UL_1059: 54 A; PackageReference: SU_10_16IT_90MF2_02; Colour: Black; Packaging: Box; Qty: 60 PCS; Revision: V1; ComponentLink1Description: Manufacturer URL; ComponentLink1URL: http://www.weidmueller.com/; ComponentLink2Description: URL Link1; ComponentLink2URL: http://catalog.weidmueller.com/catalog/Start.do?localeId=en&ObjectID=1156650000
footprint SU_10_16IT_90MF2_02 (OMNIMATE Power - Serie BU/SU 10.16IT  SU 10.16IT/02/90MF2 3.5)
pins: A1, A2